# Altium footprint library Modules.PcbLib: 4 footprints
Each footprint in its own frame and in the unit in brackets; x right, y up, seen from the top. Pads: shape width x height; smd on the part's side, far side on the other; paste and mask are expansions set on the pad; w line width, h text height; cw(c..) or ccw(c..) is an arc to the next point about the centre after c.
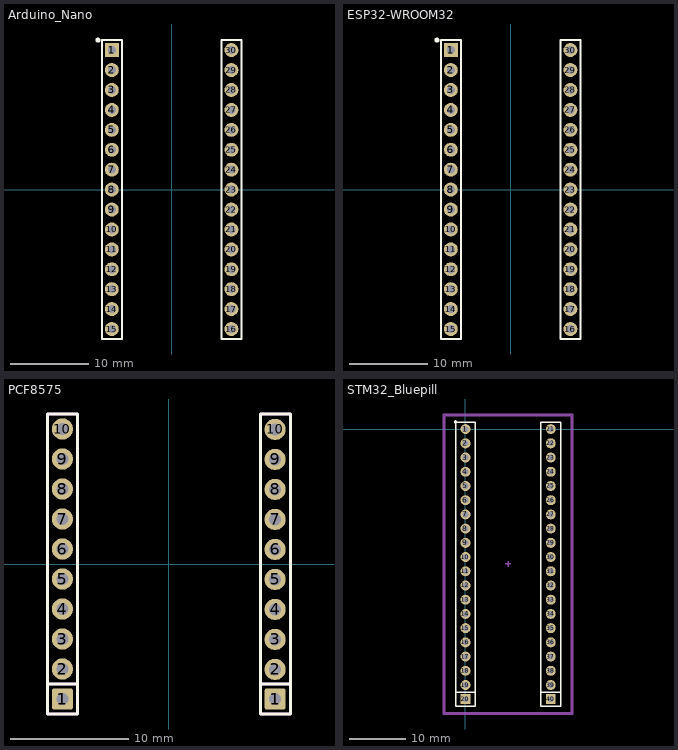
[diagram p0: the footprints below, top view; thin cyan lines are the x and y axes]

## Arduino_Nano [mil]
pads (30):
  rect 70x70 hole 40: 1(-300,700)
  round 70 hole 40: 2(-300,600) 3(-300,500) 4(-300,400) 5(-300,300) 6(-300,200) 7(-300,100) 8(-300,0) 9(-300,-100) 10(-300,-200) 11(-300,-300) 12(-300,-400) 13(-300,-500) 14(-300,-600) 15(-300,-700) 16(300,-700) 17(300,-600) 18(300,-500) 19(300,-400) 20(300,-300) 21(300,-200) 22(300,-100) 23(300,0) 24(300,100) 25(300,200) 26(300,300) 27(300,400) 28(300,500) 29(300,600) 30(300,700)
Top Overlay:
  circle w12.99: c-370,750 r5.91
  lines w10: -350,-750 -250,-750 -250,750 -350,750 -350,-750 ; 250,-750 350,-750 350,750 250,750 250,-750
Top Designator:
  text ".Designator" at -299.9,-19.99 h60
3D body "Arduino NanoV3 + Female Headers.step": height 818.9, standoff -116.14, extent -355,-861.02 349.72,914.57

## ESP32-WROOM32 [mil]
pads (30):
  rect 70x70 hole 40: 1(-300,700)
  round 70 hole 40: 2(-300,600) 3(-300,500) 4(-300,400) 5(-300,300) 6(-300,200) 7(-300,100) 8(-300,0) 9(-300,-100) 10(-300,-200) 11(-300,-300) 12(-300,-400) 13(-300,-500) 14(-300,-600) 15(-300,-700) 16(300,-700) 17(300,-600) 18(300,-500) 19(300,-400) 20(300,-300) 21(300,-200) 22(300,-100) 23(300,0) 24(300,100) 25(300,200) 26(300,300) 27(300,400) 28(300,500) 29(300,600) 30(300,700)
Top Overlay:
  circle w12.99: c-370,750 r5.91
  lines w10: -350,-750 -350,750 -250,750 -250,-750 -350,-750 ; 250,-750 250,750 350,750 350,-750 250,-750
Top Designator:
  text ".Designator" at -299.9,-19.99 h60
3D body "PCB_ESP32-38Pines.step": height 181.89, standoff -216.54, extent -512.6,-1165.41 589.76,1018.9

## PCF8575 [mm] "PCF8575 Module"
pads (20):
  rrect25% 1.8x1.8 hole 1: 1(-9,-11.43) 1(9,-11.43)
  round 1.8 hole 1: 2(-9,-8.89) 2(9,-8.93) 3(-9,-6.35) 3(9,-6.39) 4(-9,-3.81) 4(9,-3.85) 5(-9,-1.27) 5(9,-1.31) 6(-9,1.27) 6(9,1.23) 7(-9,3.81) 7(9,3.77) 8(-9,6.35) 8(9,6.31) 9(-9,8.89) 9(9,8.85) 10(-9,11.43) 10(9,11.39)
Top Overlay:
  lines w0.254: 10.312,-10.16 7.772,-10.16 7.772,-12.7 ; -10.27,-12.7 -10.27,-10.16 ; -10.27,-12.7 -10.27,12.7 -7.73,12.7 -7.73,-12.7 ; -10.27,-12.7 -7.73,-12.7 ; -10.27,-12.7 -10.27,-10.16 ; -10.27,-10.16 -7.73,-10.16 ; -10.27,-10.16 -7.73,-10.16 ; -7.73,-12.7 -7.73,-10.16 ; 7.772,-12.7 7.772,12.7 10.312,12.7 10.312,-12.7 7.772,-12.7
Top Courtyard:
  lines w0.254: 10.312,-10.16 7.772,-10.16 7.772,-12.7 ; -10.27,-12.7 -10.27,-10.16 ; -10.27,-12.7 -10.27,12.7 -7.73,12.7 -7.73,-12.7 ; -10.27,-12.7 -7.73,-12.7 ; -10.27,-12.7 -10.27,-10.16 ; -10.27,-10.16 -7.73,-10.16 ; -10.27,-10.16 -7.73,-10.16 ; -7.73,-12.7 -7.73,-10.16 ; 7.772,-12.7 7.772,12.7 10.312,12.7 10.312,-12.7 7.772,-12.7
Top Designator:
  text ".Designator" at -7.618,-0.508 h1.52
3D body "Pin Header 1x10 TH Pitch 2.54mm.stp": height 6.2, standoff -6.5, extent 7.73,-12.7 10.27,12.7
3D body "Pin Header 1x10 TH Pitch 2.54mm.stp": height 6.2, standoff -6.5, extent -10.27,-12.7 -7.73,12.7
3D body "PCF8575 I2C IO Expander.step": height 5.54, standoff 2.54, extent -10.51,-19.04 10.49,13.16

## STM32_Bluepill [mil]
pads (40):
  round 70 hole 40: 1(0,0) 2(0,-100) 3(0,-200) 4(0,-300) 5(0,-400) 6(0,-500) 7(0,-600) 8(0,-700) 9(0,-800) 10(0,-900) 11(0,-1000) 12(0,-1100) 13(0,-1200) 14(0,-1300) 15(0,-1400) 16(0,-1500) 17(0,-1600) 18(0,-1700) 19(0,-1800) 21(600,0) 22(600,-100) 23(600,-200) 24(600,-300) 25(600,-400) 26(600,-500) 27(600,-600) 28(600,-700) 29(600,-800) 30(600,-900) 31(600,-1000) 32(600,-1100) 33(600,-1200) 34(600,-1300) 35(600,-1400) 36(600,-1500) 37(600,-1600) 38(600,-1700) 39(600,-1800)
  rect 70x70 hole 40: 20(0,-1900) 40(600,-1900)
Top Overlay:
  circle w10: c-70,50 r7.13
  lines w10: -70,-1850 70,-1850 ; -70,45 -70,-1950 70,-1950 70,50 -70,50 ; 530,-1850 670,-1850 ; 530,-1950 670,-1950 670,50 530,50 530,-1950
Top Designator:
  text ".Designator" at 0.1,-969.99 h60
Bottom Courtyard:
  lines w10: -145.67,-1993.55 -145.67,94.49 745.47,94.49 745.47,-1993.55 -145.67,-1993.55
Top Courtyard (Mech15):
  lines w10: 279.53,-948.82 318.9,-948.82 ; 299.21,-968.5 299.21,-929.13 ; -157.48,-2003.94 -157.48,106.3 755.91,106.3 755.91,-2003.94 -157.48,-2003.94
3D body "YAAJ_BluePill.step": height 717.01, standoff 224.88, extent -144.88,-1993.3 744.89,93.31
3D body "c-1-535541-8-n-3d.stp": height 280, standoff -110, extent -70,-1950 70,50
3D body "c-1-535541-8-n-3d.stp": height 280, standoff -110, extent 530,-1950 670,50